# Altium footprint library ref-packages-longpad.PCBLIB: 1527 footprints (part 44 of 103)
Each footprint in its own frame and in the unit in brackets; x right, y up, seen from the top. Pads: shape width x height; smd on the part's side, far side on the other; paste and mask are expansions set on the pad; w line width, h text height; cw(c..) or ccw(c..) is an arc to the next point about the centre after c.
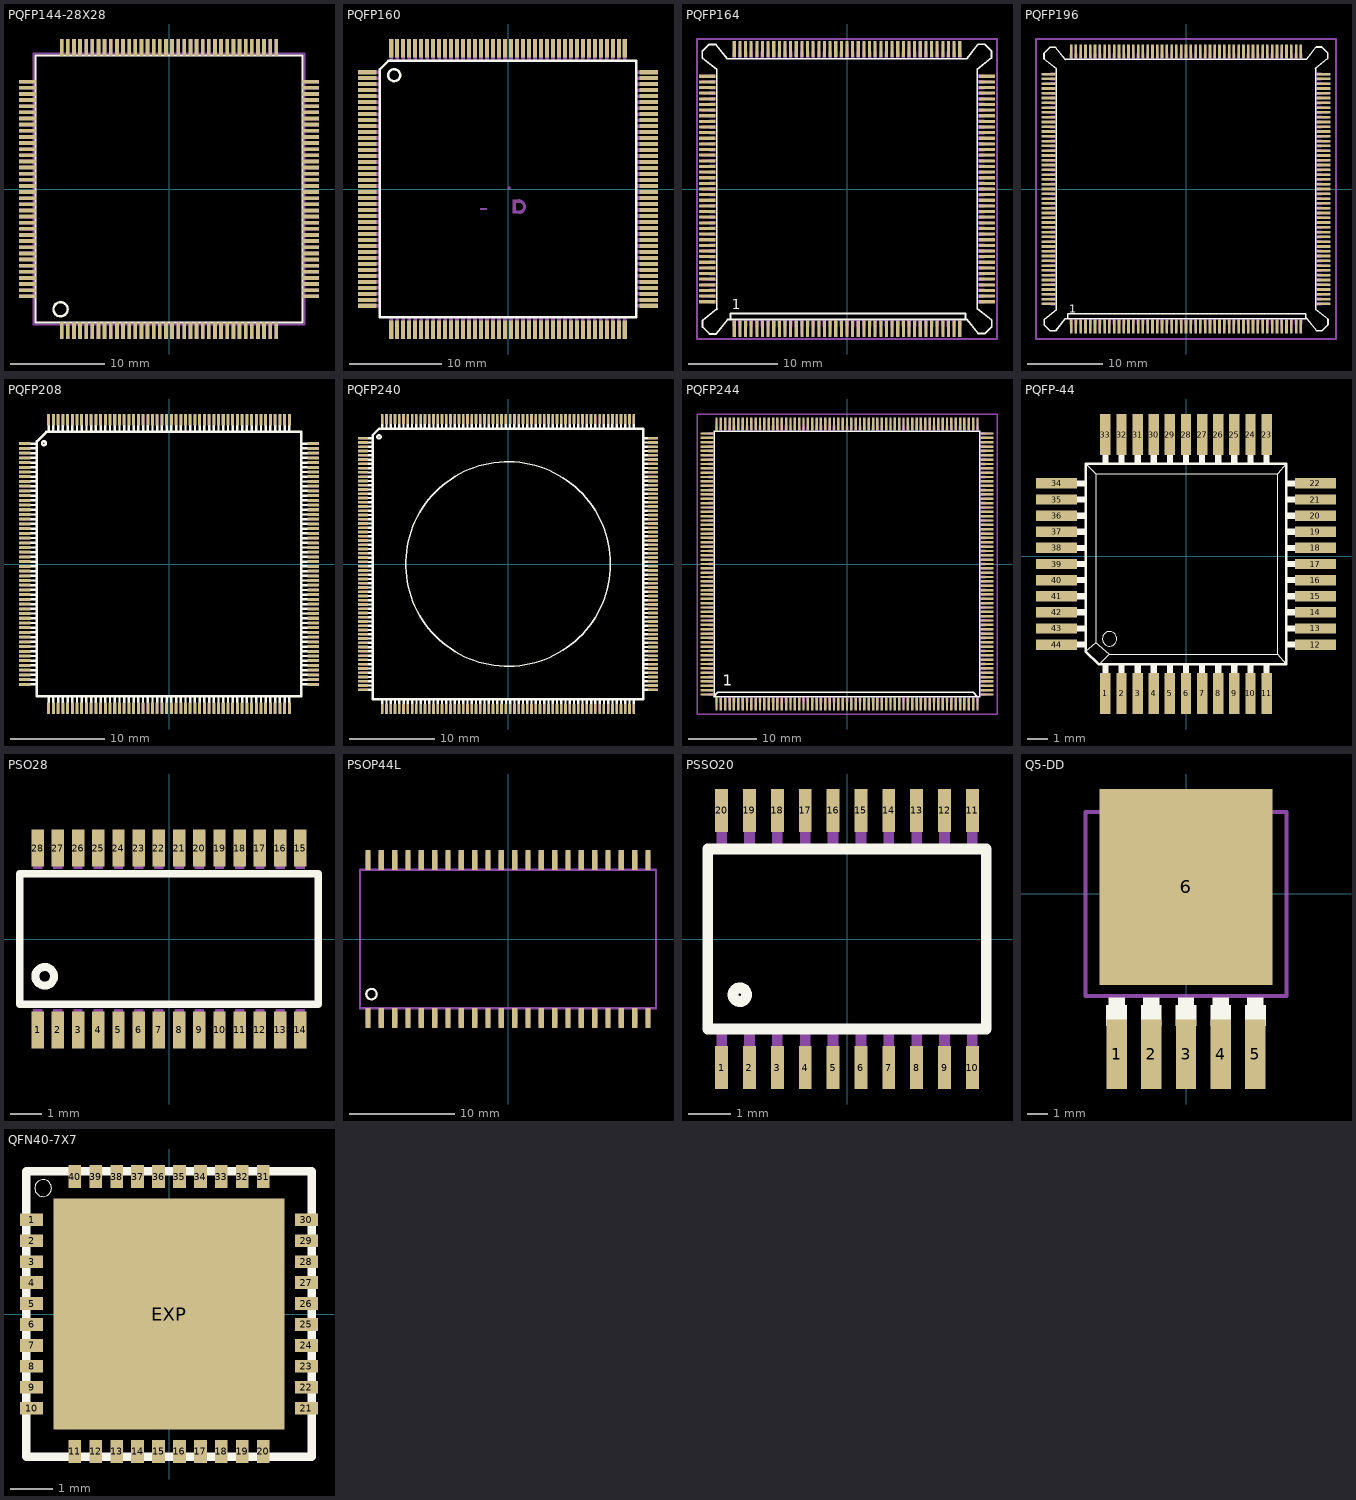
[diagram p43: the footprints below, top view; thin cyan lines are the x and y axes]

## PQFP144-28X28 [mm]
pads (144):
  rect 0.4x1.8 smd: 1(-11.375,-15) 2(-10.725,-15) 3(-10.075,-15) 4(-9.425,-15) 5(-8.775,-15) 6(-8.125,-15) 7(-7.475,-15) 8(-6.825,-15) 9(-6.175,-15) 10(-5.525,-15) 11(-4.875,-15) 12(-4.225,-15) 13(-3.575,-15) 14(-2.925,-15) 15(-2.275,-15) 16(-1.625,-15) 17(-0.975,-15) 18(-0.325,-15) 19(0.325,-15) 20(0.975,-15) 21(1.625,-15) 22(2.275,-15) 23(2.925,-15) 24(3.575,-15) 25(4.225,-15) 26(4.875,-15) 27(5.525,-15) 28(6.175,-15) 29(6.825,-15) 30(7.475,-15) 31(8.125,-15) 32(8.775,-15) 33(9.425,-15) 34(10.075,-15) 35(10.725,-15) 36(11.375,-15) 73(11.375,15) 74(10.725,15) 75(10.075,15) 76(9.425,15) 77(8.775,15) 78(8.125,15) 79(7.475,15) 80(6.825,15) 81(6.175,15) 82(5.525,15) 83(4.875,15) 84(4.225,15) 85(3.575,15) 86(2.925,15) 87(2.275,15) 88(1.625,15) 89(0.975,15) 90(0.325,15) 91(-0.325,15) 92(-0.975,15) 93(-1.625,15) 94(-2.275,15) 95(-2.925,15) 96(-3.575,15) 97(-4.225,15) 98(-4.875,15) 99(-5.525,15) 100(-6.175,15) 101(-6.825,15) 102(-7.475,15) 103(-8.125,15) 104(-8.775,15) 105(-9.425,15) 106(-10.075,15) 107(-10.725,15) 108(-11.375,15)
  rect 1.8x0.4 smd: 37(15,-11.375) 38(15,-10.725) 39(15,-10.075) 40(15,-9.425) 41(15,-8.775) 42(15,-8.125) 43(15,-7.475) 44(15,-6.825) 45(15,-6.175) 46(15,-5.525) 47(15,-4.875) 48(15,-4.225) 49(15,-3.575) 50(15,-2.925) 51(15,-2.275) 52(15,-1.625) 53(15,-0.975) 54(15,-0.325) 55(15,0.325) 56(15,0.975) 57(15,1.625) 58(15,2.275) 59(15,2.925) 60(15,3.575) 61(15,4.225) 62(15,4.875) 63(15,5.525) 64(15,6.175) 65(15,6.825) 66(15,7.475) 67(15,8.125) 68(15,8.775) 69(15,9.425) 70(15,10.075) 71(15,10.725) 72(15,11.375) 109(-15,11.375) 110(-15,10.725) 111(-15,10.075) 112(-15,9.425) 113(-15,8.775) 114(-15,8.125) 115(-15,7.475) 116(-15,6.825) 117(-15,6.175) 118(-15,5.525) 119(-15,4.875) 120(-15,4.225) 121(-15,3.575) 122(-15,2.925) 123(-15,2.275) 124(-15,1.625) 125(-15,0.975) 126(-15,0.325) 127(-15,-0.325) 128(-15,-0.975) 129(-15,-1.625) 130(-15,-2.275) 131(-15,-2.925) 132(-15,-3.575) 133(-15,-4.225) 134(-15,-4.875) 135(-15,-5.525) 136(-15,-6.175) 137(-15,-6.825) 138(-15,-7.475) 139(-15,-8.125) 140(-15,-8.775) 141(-15,-9.425) 142(-15,-10.075) 143(-15,-10.725) 144(-15,-11.375)
Top Overlay:
  circle w0.254: c-11.5,-12.75 r0.75
  lines w0.203: -14.17,-14.16 14.16,-14.16 14.16,14.16 -14.17,14.16 -14.17,-14.16
Mechanical 16:
  rectangle: -11.565,-15.9 -11.195,-14.45
  rectangle: -10.915,-15.9 -10.545,-14.45
  rectangle: -10.265,-15.9 -9.895,-14.45
  rectangle: -9.615,-15.9 -9.245,-14.45
  rectangle: -8.965,-15.9 -8.595,-14.45
  rectangle: -8.315,-15.9 -7.945,-14.45
  rectangle: -7.665,-15.9 -7.295,-14.45
  rectangle: -7.015,-15.9 -6.645,-14.45
  rectangle: -6.365,-15.9 -5.995,-14.45
  rectangle: -5.715,-15.9 -5.345,-14.45
  rectangle: -5.065,-15.9 -4.695,-14.45
  rectangle: -4.415,-15.9 -4.045,-14.45
  rectangle: -3.765,-15.9 -3.395,-14.45
  rectangle: -3.115,-15.9 -2.745,-14.45
  rectangle: -2.465,-15.9 -2.095,-14.45
  rectangle: -1.815,-15.9 -1.445,-14.45
  rectangle: -1.165,-15.9 -0.795,-14.45
  rectangle: -0.515,-15.9 -0.145,-14.45
  rectangle: 0.135,-15.9 0.505,-14.45
  rectangle: 0.785,-15.9 1.155,-14.45
  rectangle: 1.435,-15.9 1.805,-14.45
  rectangle: 2.085,-15.9 2.455,-14.45
  rectangle: 2.735,-15.9 3.105,-14.45
  rectangle: 3.385,-15.9 3.755,-14.45
  rectangle: 4.035,-15.9 4.405,-14.45
  rectangle: 4.685,-15.9 5.055,-14.45
  rectangle: 5.335,-15.9 5.705,-14.45
  rectangle: 5.985,-15.9 6.355,-14.45
  rectangle: 6.635,-15.9 7.005,-14.45
  rectangle: 7.285,-15.9 7.655,-14.45
  rectangle: 7.935,-15.9 8.305,-14.45
  rectangle: 8.585,-15.9 8.955,-14.45
  rectangle: 9.235,-15.9 9.605,-14.45
  rectangle: 9.885,-15.9 10.255,-14.45
  rectangle: 10.535,-15.9 10.905,-14.45
  rectangle: 11.185,-15.9 11.555,-14.45
  rectangle: 14.45,-11.565 15.9,-11.195
  rectangle: 14.45,-10.915 15.9,-10.545
  rectangle: 14.45,-10.265 15.9,-9.895
  rectangle: 14.45,-9.615 15.9,-9.245
  rectangle: 14.45,-8.965 15.9,-8.595
  rectangle: 14.45,-8.315 15.9,-7.945
  rectangle: 14.45,-7.665 15.9,-7.295
  rectangle: 14.45,-7.015 15.9,-6.645
  rectangle: 14.45,-6.365 15.9,-5.995
  rectangle: 14.45,-5.715 15.9,-5.345
  rectangle: 14.45,-5.065 15.9,-4.695
  rectangle: 14.45,-4.415 15.9,-4.045
  rectangle: 14.45,-3.765 15.9,-3.395
  rectangle: 14.45,-3.115 15.9,-2.745
  rectangle: 14.45,-2.465 15.9,-2.095
  rectangle: 14.45,-1.815 15.9,-1.445
  rectangle: 14.45,-1.165 15.9,-0.795
  rectangle: 14.45,-0.515 15.9,-0.145
  rectangle: 14.45,0.135 15.9,0.505
  rectangle: 14.45,0.785 15.9,1.155
  rectangle: 14.45,1.435 15.9,1.805
  rectangle: 14.45,2.085 15.9,2.455
  rectangle: 14.45,2.735 15.9,3.105
  rectangle: 14.45,3.385 15.9,3.755
  rectangle: 14.45,4.035 15.9,4.405
  rectangle: 14.45,4.685 15.9,5.055
  rectangle: 14.45,5.335 15.9,5.705
  rectangle: 14.45,5.985 15.9,6.355
  rectangle: 14.45,6.635 15.9,7.005
  rectangle: 14.45,7.285 15.9,7.655
  rectangle: 14.45,7.935 15.9,8.305
  rectangle: 14.45,8.585 15.9,8.955
  rectangle: 14.45,9.235 15.9,9.605
  rectangle: 14.45,9.885 15.9,10.255
  rectangle: 14.45,10.535 15.9,10.905
  rectangle: 14.45,11.185 15.9,11.555
  rectangle: 11.195,14.45 11.565,15.9
  rectangle: 10.545,14.45 10.915,15.9
  rectangle: 9.895,14.45 10.265,15.9
  rectangle: 9.245,14.45 9.615,15.9
  rectangle: 8.595,14.45 8.965,15.9
  rectangle: 7.945,14.45 8.315,15.9
  rectangle: 7.295,14.45 7.665,15.9
  rectangle: 6.645,14.45 7.015,15.9
  rectangle: 5.995,14.45 6.365,15.9
  rectangle: 5.345,14.45 5.715,15.9
  rectangle: 4.695,14.45 5.065,15.9
  rectangle: 4.045,14.45 4.415,15.9
  rectangle: 3.395,14.45 3.765,15.9
  rectangle: 2.745,14.45 3.115,15.9
  rectangle: 2.095,14.45 2.465,15.9
  rectangle: 1.445,14.45 1.815,15.9
  rectangle: 0.795,14.45 1.165,15.9
  rectangle: 0.145,14.45 0.515,15.9
  rectangle: -0.505,14.45 -0.135,15.9
  rectangle: -1.155,14.45 -0.785,15.9
  rectangle: -1.805,14.45 -1.435,15.9
  rectangle: -2.455,14.45 -2.085,15.9
  rectangle: -3.105,14.45 -2.735,15.9
  rectangle: -3.755,14.45 -3.385,15.9
  rectangle: -4.405,14.45 -4.035,15.9
  rectangle: -5.055,14.45 -4.685,15.9
  rectangle: -5.705,14.45 -5.335,15.9
  rectangle: -6.355,14.45 -5.985,15.9
  rectangle: -7.005,14.45 -6.635,15.9
  rectangle: -7.655,14.45 -7.285,15.9
  rectangle: -8.305,14.45 -7.935,15.9
  rectangle: -8.955,14.45 -8.585,15.9
  rectangle: -9.605,14.45 -9.235,15.9
  rectangle: -10.255,14.45 -9.885,15.9
  rectangle: -10.905,14.45 -10.535,15.9
  rectangle: -11.555,14.45 -11.185,15.9
  rectangle: -15.9,11.195 -14.45,11.565
  rectangle: -15.9,10.545 -14.45,10.915
  rectangle: -15.9,9.895 -14.45,10.265
  rectangle: -15.9,9.245 -14.45,9.615
  rectangle: -15.9,8.595 -14.45,8.965
  rectangle: -15.9,7.945 -14.45,8.315
  rectangle: -15.9,7.295 -14.45,7.665
  rectangle: -15.9,6.645 -14.45,7.015
  rectangle: -15.9,5.995 -14.45,6.365
  rectangle: -15.9,5.345 -14.45,5.715
  rectangle: -15.9,4.695 -14.45,5.065
  rectangle: -15.9,4.045 -14.45,4.415
  rectangle: -15.9,3.395 -14.45,3.765
  rectangle: -15.9,2.745 -14.45,3.115
  rectangle: -15.9,2.095 -14.45,2.465
  rectangle: -15.9,1.445 -14.45,1.815
  rectangle: -15.9,0.795 -14.45,1.165
  rectangle: -15.9,0.145 -14.45,0.515
  rectangle: -15.9,-0.505 -14.45,-0.135
  rectangle: -15.9,-1.155 -14.45,-0.785
  rectangle: -15.9,-1.805 -14.45,-1.435
  rectangle: -15.9,-2.455 -14.45,-2.085
  rectangle: -15.9,-3.105 -14.45,-2.735
  rectangle: -15.9,-3.755 -14.45,-3.385
  rectangle: -15.9,-4.405 -14.45,-4.035
  rectangle: -15.9,-5.055 -14.45,-4.685
  rectangle: -15.9,-5.705 -14.45,-5.335
  rectangle: -15.9,-6.355 -14.45,-5.985
  rectangle: -15.9,-7.005 -14.45,-6.635
  rectangle: -15.9,-7.655 -14.45,-7.285
  rectangle: -15.9,-8.305 -14.45,-7.935
  rectangle: -15.9,-8.955 -14.45,-8.585
  rectangle: -15.9,-9.605 -14.45,-9.235
  rectangle: -15.9,-10.255 -14.45,-9.885
  rectangle: -15.9,-10.905 -14.45,-10.535
  rectangle: -15.9,-11.555 -14.45,-11.185
  lines w0.203: -14.36,-14.36 14.36,-14.36 14.36,14.36 -14.36,14.36 -14.36,-14.36

## PQFP160 [mm]
pads (160):
  rect 2x0.45 smd: 1(-15.275,12.675) 2(-15.275,12.025) 3(-15.275,11.375) 4(-15.275,10.725) 5(-15.275,10.075) 6(-15.275,9.425) 7(-15.275,8.775) 8(-15.275,8.125) 9(-15.275,7.475) 10(-15.275,6.825) 11(-15.275,6.175) 12(-15.275,5.525) 13(-15.275,4.875) 14(-15.275,4.225) 15(-15.275,3.575) 16(-15.275,2.925) 17(-15.275,2.275) 18(-15.275,1.625) 19(-15.275,0.975) 20(-15.275,0.325) 21(-15.275,-0.325) 22(-15.275,-0.975) 23(-15.275,-1.625) 24(-15.275,-2.275) 25(-15.275,-2.925) 26(-15.275,-3.575) 27(-15.275,-4.225) 28(-15.275,-4.875) 29(-15.275,-5.525) 30(-15.275,-6.175) 31(-15.275,-6.825) 32(-15.275,-7.475) 33(-15.275,-8.125) 34(-15.275,-8.775) 35(-15.275,-9.425) 36(-15.275,-10.075) 37(-15.275,-10.725) 38(-15.275,-11.375) 39(-15.275,-12.025) 40(-15.275,-12.675) 81(15.275,-12.675) 82(15.275,-12.025) 83(15.275,-11.375) 84(15.275,-10.725) 85(15.275,-10.075) 86(15.275,-9.425) 87(15.275,-8.775) 88(15.275,-8.125) 89(15.275,-7.475) 90(15.275,-6.825) 91(15.275,-6.175) 92(15.275,-5.525) 93(15.275,-4.875) 94(15.275,-4.225) 95(15.275,-3.575) 96(15.275,-2.925) 97(15.275,-2.275) 98(15.275,-1.625) 99(15.275,-0.975) 100(15.275,-0.325) 101(15.275,0.325) 102(15.275,0.975) 103(15.275,1.625) 104(15.275,2.275) 105(15.275,2.925) 106(15.275,3.575) 107(15.275,4.225) 108(15.275,4.875) 109(15.275,5.525) 110(15.275,6.175) 111(15.275,6.825) 112(15.275,7.475) 113(15.275,8.125) 114(15.275,8.775) 115(15.275,9.425) 116(15.275,10.075) 117(15.275,10.725) 118(15.275,11.375) 119(15.275,12.025) 120(15.275,12.675)
  rect 0.45x2 smd: 41(-12.675,-15.275) 42(-12.025,-15.275) 43(-11.375,-15.275) 44(-10.725,-15.275) 45(-10.075,-15.275) 46(-9.425,-15.275) 47(-8.775,-15.275) 48(-8.125,-15.275) 49(-7.475,-15.275) 50(-6.825,-15.275) 51(-6.175,-15.275) 52(-5.525,-15.275) 53(-4.875,-15.275) 54(-4.225,-15.275) 55(-3.575,-15.275) 56(-2.925,-15.275) 57(-2.275,-15.275) 58(-1.625,-15.275) 59(-0.975,-15.275) 60(-0.325,-15.275) 61(0.325,-15.275) 62(0.975,-15.275) 63(1.625,-15.275) 64(2.275,-15.275) 65(2.925,-15.275) 66(3.575,-15.275) 67(4.225,-15.275) 68(4.875,-15.275) 69(5.525,-15.275) 70(6.175,-15.275) 71(6.825,-15.275) 72(7.475,-15.275) 73(8.125,-15.275) 74(8.775,-15.275) 75(9.425,-15.275) 76(10.075,-15.275) 77(10.725,-15.275) 78(11.375,-15.275) 79(12.025,-15.275) 80(12.675,-15.275) 121(12.675,15.275) 122(12.025,15.275) 123(11.375,15.275) 124(10.725,15.275) 125(10.075,15.275) 126(9.425,15.275) 127(8.775,15.275) 128(8.125,15.275) 129(7.475,15.275) 130(6.825,15.275) 131(6.175,15.275) 132(5.525,15.275) 133(4.875,15.275) 134(4.225,15.275) 135(3.575,15.275) 136(2.925,15.275) 137(2.275,15.275) 138(1.625,15.275) 139(0.975,15.275) 140(0.325,15.275) 141(-0.325,15.275) 142(-0.975,15.275) 143(-1.625,15.275) 144(-2.275,15.275) 145(-2.925,15.275) 146(-3.575,15.275) 147(-4.225,15.275) 148(-4.875,15.275) 149(-5.525,15.275) 150(-6.175,15.275) 151(-6.825,15.275) 152(-7.475,15.275) 153(-8.125,15.275) 154(-8.775,15.275) 155(-9.425,15.275) 156(-10.075,15.275) 157(-10.725,15.275) 158(-11.375,15.275) 159(-12.025,15.275) 160(-12.675,15.275)
Top Overlay:
  circle w0.254: c-12.35,12.35 r0.65
  lines w0.254: -13.9,-13.9 13.9,-13.9 13.9,13.9 -13,13.9 -13.9,13 -13.9,-13.9
Mechanical 16:
  drawing of 173 lines, arcs and shapes, not listed
  text "PQFP 160" at -3.96,-9.81 h1.26

## PQFP164 [mm]
pads (164):
  rect 0.35x1.8 smd: 1(-12.7,-15.8) 2(-12.065,-15.8) 3(-11.43,-15.8) 4(-10.795,-15.8) 5(-10.16,-15.8) 6(-9.525,-15.8) 7(-8.89,-15.8) 8(-8.255,-15.8) 9(-7.62,-15.8) 10(-6.985,-15.8) 11(-6.35,-15.8) 12(-5.715,-15.8) 13(-5.08,-15.8) 14(-4.445,-15.8) 15(-3.81,-15.8) 16(-3.175,-15.8) 17(-2.54,-15.8) 18(-1.905,-15.8) 19(-1.27,-15.8) 20(-0.635,-15.8) 21(0,-15.8) 22(0.635,-15.8) 23(1.27,-15.8) 24(1.905,-15.8) 25(2.54,-15.8) 26(3.175,-15.8) 27(3.81,-15.8) 28(4.445,-15.8) 29(5.08,-15.8) 30(5.715,-15.8) 31(6.35,-15.8) 32(6.985,-15.8) 33(7.62,-15.8) 34(8.255,-15.8) 35(8.89,-15.8) 36(9.525,-15.8) 37(10.16,-15.8) 38(10.795,-15.8) 39(11.43,-15.8) 40(12.065,-15.8) 41(12.7,-15.8) 83(12.7,15.8) 84(12.065,15.8) 85(11.43,15.8) 86(10.795,15.8) 87(10.16,15.8) 88(9.525,15.8) 89(8.89,15.8) 90(8.255,15.8) 91(7.62,15.8) 92(6.985,15.8) 93(6.35,15.8) 94(5.715,15.8) 95(5.08,15.8) 96(4.445,15.8) 97(3.81,15.8) 98(3.175,15.8) 99(2.54,15.8) 100(1.905,15.8) 101(1.27,15.8) 102(0.635,15.8) 103(0,15.8) 104(-0.635,15.8) 105(-1.27,15.8) 106(-1.905,15.8) 107(-2.54,15.8) 108(-3.175,15.8) 109(-3.81,15.8) 110(-4.445,15.8) 111(-5.08,15.8) 112(-5.715,15.8) 113(-6.35,15.8) 114(-6.985,15.8) 115(-7.62,15.8) 116(-8.255,15.8) 117(-8.89,15.8) 118(-9.525,15.8) 119(-10.16,15.8) 120(-10.795,15.8) 121(-11.43,15.8) 122(-12.065,15.8) 123(-12.7,15.8)
  rect 1.8x0.35 smd: 42(15.8,-12.7) 43(15.8,-12.065) 44(15.8,-11.43) 45(15.8,-10.795) 46(15.8,-10.16) 47(15.8,-9.525) 48(15.8,-8.89) 49(15.8,-8.255) 50(15.8,-7.62) 51(15.8,-6.985) 52(15.8,-6.35) 53(15.8,-5.715) 54(15.8,-5.08) 55(15.8,-4.445) 56(15.8,-3.81) 57(15.8,-3.175) 58(15.8,-2.54) 59(15.8,-1.905) 60(15.8,-1.27) 61(15.8,-0.635) 62(15.8,0) 63(15.8,0.635) 64(15.8,1.27) 65(15.8,1.905) 66(15.8,2.54) 67(15.8,3.175) 68(15.8,3.81) 69(15.8,4.445) 70(15.8,5.08) 71(15.8,5.715) 72(15.8,6.35) 73(15.8,6.985) 74(15.8,7.62) 75(15.8,8.255) 76(15.8,8.89) 77(15.8,9.525) 78(15.8,10.16) 79(15.8,10.795) 80(15.8,11.43) 81(15.8,12.065) 82(15.8,12.7) 124(-15.8,12.7) 125(-15.8,12.065) 126(-15.8,11.43) 127(-15.8,10.795) 128(-15.8,10.16) 129(-15.8,9.525) 130(-15.8,8.89) 131(-15.8,8.255) 132(-15.8,7.62) 133(-15.8,6.985) 134(-15.8,6.35) 135(-15.8,5.715) 136(-15.8,5.08) 137(-15.8,4.445) 138(-15.8,3.81) 139(-15.8,3.175) 140(-15.8,2.54) 141(-15.8,1.905) 142(-15.8,1.27) 143(-15.8,0.635) 144(-15.8,0) 145(-15.8,-0.635) 146(-15.8,-1.27) 147(-15.8,-1.905) 148(-15.8,-2.54) 149(-15.8,-3.175) 150(-15.8,-3.81) 151(-15.8,-4.445) 152(-15.8,-5.08) 153(-15.8,-5.715) 154(-15.8,-6.35) 155(-15.8,-6.985) 156(-15.8,-7.62) 157(-15.8,-8.255) 158(-15.8,-8.89) 159(-15.8,-9.525) 160(-15.8,-10.16) 161(-15.8,-10.795) 162(-15.8,-11.43) 163(-15.8,-12.065) 164(-15.8,-12.7)
Top Overlay:
  lines w0.203: -16.3,14.752 -16.3,15.514 ; -16.286,14.752 -14.68,13.482 ; -16.286,15.514 -15.524,16.29 -14.762,16.29 ; -16.27,-14.782 -16.27,-15.544 -15.494,-16.306 ; -16.256,-14.782 -14.65,-13.512 ; -15.494,-16.32 -14.732,-16.32 ; -14.762,16.276 -13.492,14.67 ; -14.732,-16.306 -13.462,-14.7 -13.126,-14.7 ; -14.68,-13.442 -14.68,13.4 ; -13.442,14.68 13.4,14.68 ; 13.335,-14.655 13.335,-14.02 -13.126,-14.02 -13.126,-14.7 ; 13.462,-14.7 -13.126,-14.7 ; 13.482,14.68 14.752,16.286 ; 13.492,-14.67 14.762,-16.276 ; 14.67,13.492 16.276,14.762 ; 14.68,-13.482 16.286,-14.752 ; 14.68,-13.4 14.68,13.442 ; 14.752,16.3 15.514,16.3 ; 14.762,-16.29 15.524,-16.29 16.286,-15.514 ; 15.514,16.286 16.29,15.524 16.29,14.762 ; 16.3,-15.514 16.3,-14.752
  text "1" at -12.96,-13.93 h1.97
Mechanical 16:
  drawing of 328 lines, arcs and shapes, not listed
Mechanical 27:
  lines w0.2: -16.9,-16.9 -16.9,16.9 16.9,16.9 16.9,-16.9 -16.9,-16.9

## PQFP196 [mm]
pads (196):
  rect 0.35x1.8 smd: 1(-15.24,-18.3) 2(-14.605,-18.3) 3(-13.97,-18.3) 4(-13.335,-18.3) 5(-12.7,-18.3) 6(-12.065,-18.3) 7(-11.43,-18.3) 8(-10.795,-18.3) 9(-10.16,-18.3) 10(-9.525,-18.3) 11(-8.89,-18.3) 12(-8.255,-18.3) 13(-7.62,-18.3) 14(-6.985,-18.3) 15(-6.35,-18.3) 16(-5.715,-18.3) 17(-5.08,-18.3) 18(-4.445,-18.3) 19(-3.81,-18.3) 20(-3.175,-18.3) 21(-2.54,-18.3) 22(-1.905,-18.3) 23(-1.27,-18.3) 24(-0.635,-18.3) 25(0,-18.3) 26(0.635,-18.3) 27(1.27,-18.3) 28(1.905,-18.3) 29(2.54,-18.3) 30(3.175,-18.3) 31(3.81,-18.3) 32(4.445,-18.3) 33(5.08,-18.3) 34(5.715,-18.3) 35(6.35,-18.3) 36(6.985,-18.3) 37(7.62,-18.3) 38(8.255,-18.3) 39(8.89,-18.3) 40(9.525,-18.3) 41(10.16,-18.3) 42(10.795,-18.3) 43(11.43,-18.3) 44(12.065,-18.3) 45(12.7,-18.3) 46(13.335,-18.3) 47(13.97,-18.3) 48(14.605,-18.3) 49(15.24,-18.3) 99(15.24,18.3) 100(14.605,18.3) 101(13.97,18.3) 102(13.335,18.3) 103(12.7,18.3) 104(12.065,18.3) 105(11.43,18.3) 106(10.795,18.3) 107(10.16,18.3) 108(9.525,18.3) 109(8.89,18.3) 110(8.255,18.3) 111(7.62,18.3) 112(6.985,18.3) 113(6.35,18.3) 114(5.715,18.3) 115(5.08,18.3) 116(4.445,18.3) 117(3.81,18.3) 118(3.175,18.3) 119(2.54,18.3) 120(1.905,18.3) 121(1.27,18.3) 122(0.635,18.3) 123(0,18.3) 124(-0.635,18.3) 125(-1.27,18.3) 126(-1.905,18.3) 127(-2.54,18.3) 128(-3.175,18.3) 129(-3.81,18.3) 130(-4.445,18.3) 131(-5.08,18.3) 132(-5.715,18.3) 133(-6.35,18.3) 134(-6.985,18.3) 135(-7.62,18.3) 136(-8.255,18.3) 137(-8.89,18.3) 138(-9.525,18.3) 139(-10.16,18.3) 140(-10.795,18.3) 141(-11.43,18.3) 142(-12.065,18.3) 143(-12.7,18.3) 144(-13.335,18.3) 145(-13.97,18.3) 146(-14.605,18.3) 147(-15.24,18.3)
  rect 1.8x0.35 smd: 50(18.3,-15.24) 51(18.3,-14.605) 52(18.3,-13.97) 53(18.3,-13.335) 54(18.3,-12.7) 55(18.3,-12.065) 56(18.3,-11.43) 57(18.3,-10.795) 58(18.3,-10.16) 59(18.3,-9.525) 60(18.3,-8.89) 61(18.3,-8.255) 62(18.3,-7.62) 63(18.3,-6.985) 64(18.3,-6.35) 65(18.3,-5.715) 66(18.3,-5.08) 67(18.3,-4.445) 68(18.3,-3.81) 69(18.3,-3.175) 70(18.3,-2.54) 71(18.3,-1.905) 72(18.3,-1.27) 73(18.3,-0.635) 74(18.3,0) 75(18.3,0.635) 76(18.3,1.27) 77(18.3,1.905) 78(18.3,2.54) 79(18.3,3.175) 80(18.3,3.81) 81(18.3,4.445) 82(18.3,5.08) 83(18.3,5.715) 84(18.3,6.35) 85(18.3,6.985) 86(18.3,7.62) 87(18.3,8.255) 88(18.3,8.89) 89(18.3,9.525) 90(18.3,10.16) 91(18.3,10.795) 92(18.3,11.43) 93(18.3,12.065) 94(18.3,12.7) 95(18.3,13.335) 96(18.3,13.97) 97(18.3,14.605) 98(18.3,15.24) 148(-18.3,15.24) 149(-18.3,14.605) 150(-18.3,13.97) 151(-18.3,13.335) 152(-18.3,12.7) 153(-18.3,12.065) 154(-18.3,11.43) 155(-18.3,10.795) 156(-18.3,10.16) 157(-18.3,9.525) 158(-18.3,8.89) 159(-18.3,8.255) 160(-18.3,7.62) 161(-18.3,6.985) 162(-18.3,6.35) 163(-18.3,5.715) 164(-18.3,5.08) 165(-18.3,4.445) 166(-18.3,3.81) 167(-18.3,3.175) 168(-18.3,2.54) 169(-18.3,1.905) 170(-18.3,1.27) 171(-18.3,0.635) 172(-18.3,0) 173(-18.3,-0.635) 174(-18.3,-1.27) 175(-18.3,-1.905) 176(-18.3,-2.54) 177(-18.3,-3.175) 178(-18.3,-3.81) 179(-18.3,-4.445) 180(-18.3,-5.08) 181(-18.3,-5.715) 182(-18.3,-6.35) 183(-18.3,-6.985) 184(-18.3,-7.62) 185(-18.3,-8.255) 186(-18.3,-8.89) 187(-18.3,-9.525) 188(-18.3,-10.16) 189(-18.3,-10.795) 190(-18.3,-11.43) 191(-18.3,-12.065) 192(-18.3,-12.7) 193(-18.3,-13.335) 194(-18.3,-13.97) 195(-18.3,-14.605) 196(-18.3,-15.24)
Top Overlay:
  lines w0.203: -18.84,17.252 -18.84,18.014 ; -18.826,17.252 -17.22,15.982 ; -18.826,18.014 -18.064,18.79 -17.302,18.79 ; -18.81,-17.282 -18.81,-18.044 -18.034,-18.806 ; -18.796,-17.282 -17.19,-16.012 ; -18.034,-18.82 -17.272,-18.82 ; -17.302,18.776 -16.032,17.17 ; -17.272,-18.806 -16.002,-17.2 -15.666,-17.2 ; -17.22,-16.022 -17.22,15.9 ; -16.022,17.22 15.9,17.22 ; 15.875,-17.155 15.875,-16.52 -15.666,-16.52 -15.666,-17.2 ; 15.982,17.22 17.252,18.826 ; 16.002,-17.2 -15.666,-17.2 ; 16.032,-17.17 17.302,-18.776 ; 17.17,16.032 18.776,17.302 ; 17.22,-15.982 18.826,-17.252 ; 17.22,-15.9 17.22,16.022 ; 17.252,18.84 18.014,18.84 ; 17.302,-18.79 18.064,-18.79 18.826,-18.014 ; 18.014,18.826 18.79,18.064 18.79,17.302 ; 18.84,-18.014 18.84,-17.252
  text "1" at -15.5,-16.43 h1.08
Mechanical 16:
  drawing of 392 lines, arcs and shapes, not listed
Mechanical 27:
  lines w0.2: -19.9,-19.9 -19.9,19.9 19.9,19.9 19.9,-19.9 -19.9,-19.9

## PQFP208 [mil]
pads (208):
  rect 47.24x12.6 smd: 1(-602.36,501.97) 2(-602.36,482.28) 3(-602.36,462.6) 4(-602.36,442.91) 5(-602.36,423.23) 6(-602.36,403.54) 7(-602.36,383.86) 8(-602.36,364.17) 9(-602.36,344.49) 10(-602.36,324.8) 11(-602.36,305.12) 12(-602.36,285.43) 13(-602.36,265.75) 14(-602.36,246.06) 15(-602.36,226.38) 16(-602.36,206.69) 17(-602.36,187.01) 18(-602.36,167.32) 19(-602.36,147.64) 20(-602.36,127.95) 21(-602.36,108.27) 22(-602.36,88.58) 23(-602.36,68.9) 24(-602.36,49.21) 25(-602.36,29.53) 26(-602.36,9.84) 27(-602.36,-9.84) 28(-602.36,-29.53) 29(-602.36,-49.21) 30(-602.36,-68.9) 31(-602.36,-88.58) 32(-602.36,-108.27) 33(-602.36,-127.95) 34(-602.36,-147.64) 35(-602.36,-167.32) 36(-602.36,-187.01) 37(-602.36,-206.69) 38(-602.36,-226.38) 39(-602.36,-246.06) 40(-602.36,-265.75) 41(-602.36,-285.43) 42(-602.36,-305.12) 43(-602.36,-324.8) 44(-602.36,-344.49) 45(-602.36,-364.17) 46(-602.36,-383.86) 47(-602.36,-403.54) 48(-602.36,-423.23) 49(-602.36,-442.91) 50(-602.36,-462.6) 51(-602.36,-482.28) 52(-602.36,-501.97) 105(602.36,-501.97) 106(602.36,-482.28) 107(602.36,-462.6) 108(602.36,-442.91) 109(602.36,-423.23) 110(602.36,-403.54) 111(602.36,-383.86) 112(602.36,-364.17) 113(602.36,-344.49) 114(602.36,-324.8) 115(602.36,-305.12) 116(602.36,-285.43) 117(602.36,-265.75) 118(602.36,-246.06) 119(602.36,-226.38) 120(602.36,-206.69) 121(602.36,-187.01) 122(602.36,-167.32) 123(602.36,-147.64) 124(602.36,-127.95) 125(602.36,-108.27) 126(602.36,-88.58) 127(602.36,-68.9) 128(602.36,-49.21) 129(602.36,-29.53) 130(602.36,-9.84) 131(602.36,9.84) 132(602.36,29.53) 133(602.36,49.21) 134(602.36,68.9) 135(602.36,88.58) 136(602.36,108.27) 137(602.36,127.95) 138(602.36,147.64) 139(602.36,167.32) 140(602.36,187.01) 141(602.36,206.69) 142(602.36,226.38) 143(602.36,246.06) 144(602.36,265.75) 145(602.36,285.43) 146(602.36,305.12) 147(602.36,324.8) 148(602.36,344.49) 149(602.36,364.17) 150(602.36,383.86) 151(602.36,403.54) 152(602.36,423.23) 153(602.36,442.91) 154(602.36,462.6) 155(602.36,482.28) 156(602.36,501.97)
  rect 12.6x47.24 smd: 53(-501.97,-602.36) 54(-482.28,-602.36) 55(-462.6,-602.36) 56(-442.91,-602.36) 57(-423.23,-602.36) 58(-403.54,-602.36) 59(-383.86,-602.36) 60(-364.17,-602.36) 61(-344.49,-602.36) 62(-324.8,-602.36) 63(-305.12,-602.36) 64(-285.43,-602.36) 65(-265.75,-602.36) 66(-246.06,-602.36) 67(-226.38,-602.36) 68(-206.69,-602.36) 69(-187.01,-602.36) 70(-167.32,-602.36) 71(-147.64,-602.36) 72(-127.95,-602.36) 73(-108.27,-602.36) 74(-88.58,-602.36) 75(-68.9,-602.36) 76(-49.21,-602.36) 77(-29.53,-602.36) 78(-9.84,-602.36) 79(9.84,-602.36) 80(29.53,-602.36) 81(49.21,-602.36) 82(68.9,-602.36) 83(88.58,-602.36) 84(108.27,-602.36) 85(127.95,-602.36) 86(147.64,-602.36) 87(167.32,-602.36) 88(187.01,-602.36) 89(206.69,-602.36) 90(226.38,-602.36) 91(246.06,-602.36) 92(265.75,-602.36) 93(285.43,-602.36) 94(305.12,-602.36) 95(324.8,-602.36) 96(344.49,-602.36) 97(364.17,-602.36) 98(383.86,-602.36) 99(403.54,-602.36) 100(423.23,-602.36) 101(442.91,-602.36) 102(462.6,-602.36) 103(482.28,-602.36) 104(501.97,-602.36) 157(501.97,602.36) 158(482.28,602.36) 159(462.6,602.36) 160(442.91,602.36) 161(423.23,602.36) 162(403.54,602.36) 163(383.86,602.36) 164(364.17,602.36) 165(344.49,602.36) 166(324.8,602.36) 167(305.12,602.36) 168(285.43,602.36) 169(265.75,602.36) 170(246.06,602.36) 171(226.38,602.36) 172(206.69,602.36) 173(187.01,602.36) 174(167.32,602.36) 175(147.64,602.36) 176(127.95,602.36) 177(108.27,602.36) 178(88.58,602.36) 179(68.9,602.36) 180(49.21,602.36) 181(29.53,602.36) 182(9.84,602.36) 183(-9.84,602.36) 184(-29.53,602.36) 185(-49.21,602.36) 186(-68.9,602.36) 187(-88.58,602.36) 188(-108.27,602.36) 189(-127.95,602.36) 190(-147.64,602.36) 191(-167.32,602.36) 192(-187.01,602.36) 193(-206.69,602.36) 194(-226.38,602.36) 195(-246.06,602.36) 196(-265.75,602.36) 197(-285.43,602.36) 198(-305.12,602.36) 199(-324.8,602.36) 200(-344.49,602.36) 201(-364.17,602.36) 202(-383.86,602.36) 203(-403.54,602.36) 204(-423.23,602.36) 205(-442.91,602.36) 206(-462.6,602.36) 207(-482.28,602.36) 208(-501.97,602.36)